# Altium footprint library General.PcbLib: 446 footprints (part 18 of 28)
Each footprint in its own frame and in the unit in brackets; x right, y up, seen from the top. Pads: shape width x height; smd on the part's side, far side on the other; paste and mask are expansions set on the pad; w line width, h text height; cw(c..) or ccw(c..) is an arc to the next point about the centre after c.
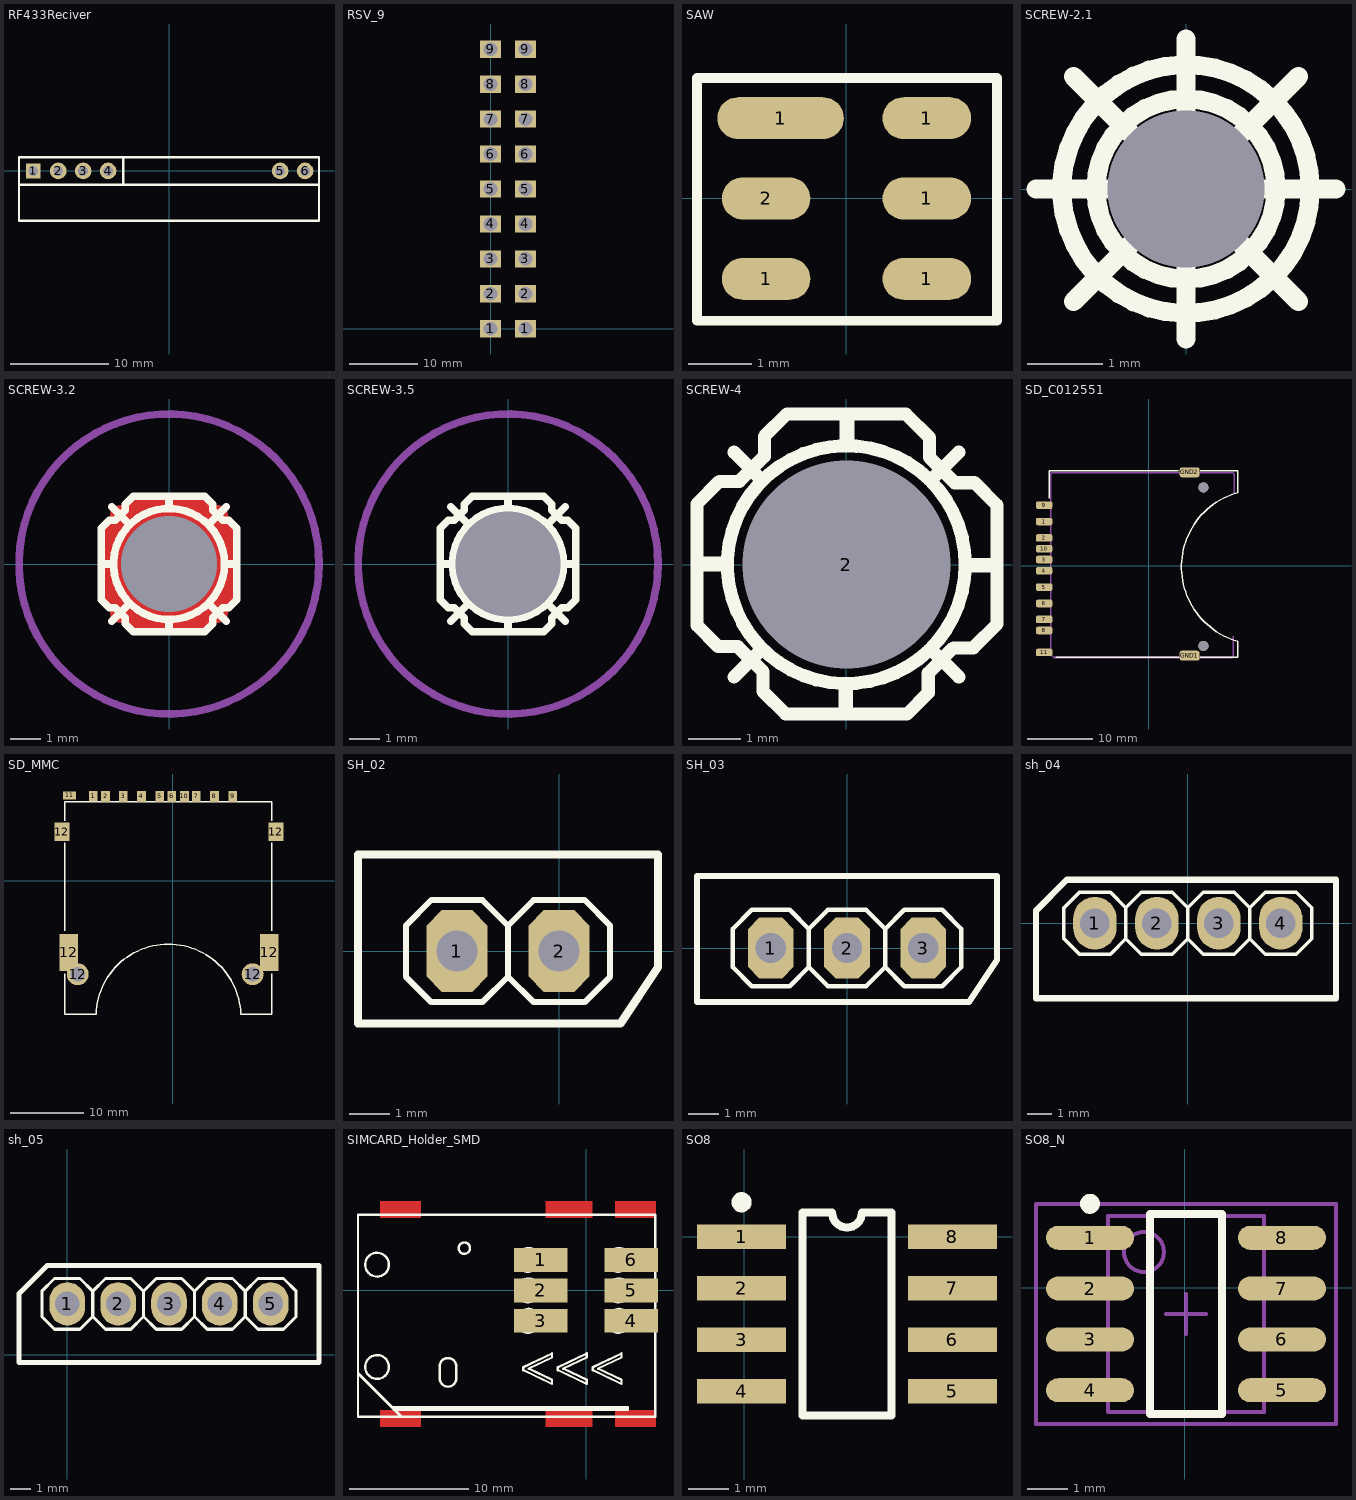
[diagram p17: the footprints below, top view; thin cyan lines are the x and y axes]

## RF433Reciver [mm]
pads (6):
  rect 1.5x1.5 hole 1: 1(-13.85,0)
  round 1.7 hole 1: 2(-11.31,0) 3(-8.77,0) 4(-6.23,0) 5(11.31,0) 6(13.85,0)
Top Overlay:
  lines w0.254: -15.309,-1.397 15.272,-1.397 ; -4.667,-1.397 -4.667,1.346 ; -15.309,-5.08 15.272,-5.08 15.272,1.397 -15.309,1.397 -15.309,1.194 -15.309,-5.08
3D body "rfModule_my.step": height 8.8, standoff -5.5, extent -15.145,-7.688 15.095,0.337

## RSV_9 [mm]
pads (18):
  rect 3x2.5 hole 2: 1(0,0) 1(5.08,0) 2(0,5.08) 2(5.08,5.08) 3(0,10.16) 3(5.08,10.16) 4(0,15.24) 4(5.08,15.24) 5(0,20.32) 5(5.08,20.32) 6(0,25.4) 6(5.08,25.4) 7(0,30.48) 7(5.08,30.48) 8(0,35.56) 8(5.08,35.56) 9(0,40.64) 9(5.08,40.64)

## SAW [mm]
pads (6):
  oval 1.4x0.665 smd: 1(-1.27,-1.27) 1(1.27,-1.27) 1(1.27,0) 1(1.27,1.27) 2(-1.27,0)
  oval 2x0.665 smd: 1(-1.041,1.27)
Top Overlay:
  lines w0.152: -2.362,-1.93 -2.362,1.905 2.379,1.905 2.379,-1.93 -2.362,-1.93
3D body "saw.STEP": height 1.14, standoff -0.09, extent -1.525,-1.473 1.475,1.527

## SCREW-2.1 [mm]
pads (1):
  round 0 hole 2.1 unplated: 1(0,0)
Top Overlay:
  circle w0.254: c0,0 r1.201
  circle w0.254: c0,0 r1.657
  lines w0.254: -2,0 2,0 ; -1.5,-1.5 1.5,1.5 ; -1.5,1.5 1.5,-1.5 ; 0,-2 0,2
Bottom Overlay:
  circle w0.254: c0,0 r1.657
  circle w0.254: c0,0 r1.201
  lines w0.254: -2,0 2,0 ; -1.5,-1.5 1.5,1.5 ; -1.5,1.5 1.5,-1.5 ; 0,-2 0,2

## SCREW-3.2 [mm]
height 1.35
pads (1):
  round 0 hole 3.2: 1(0,0)
Top Layer:
  pour cut-out: -1.194,-2.261 1.194,-2.261 1.46,-1.994 1.905,-1.905 1.994,-1.46 2.261,-1.194 2.261,1.194 1.994,1.46 1.905,1.905 1.46,1.994 1.194,2.261 -1.194,2.261 -1.46,1.994 -1.905,1.905 -1.994,1.46 -2.261,1.194 -2.261,-1.194 -1.994,-1.46 -1.905,-1.905 -1.46,-1.994
Bottom Layer:
  pour cut-out: -1.194,-2.261 1.194,-2.261 1.46,-1.994 1.905,-1.905 1.994,-1.46 2.261,-1.194 2.261,1.194 1.994,1.46 1.905,1.905 1.46,1.994 1.194,2.261 -1.194,2.261 -1.46,1.994 -1.905,1.905 -1.994,1.46 -2.261,1.194 -2.261,-1.194 -1.994,-1.46 -1.905,-1.905 -1.46,-1.994
Top Overlay:
  circle w0.254: c0,0 r1.852
  lines w0.254: -1.905,-1.905 -1.321,-1.321 ; -1.905,1.905 -1.321,1.321 ; 1.321,-1.321 1.905,-1.905 ; 1.321,1.321 1.905,1.905 ; -2.261,0 -2.261,-1.194 -1.994,-1.46 -1.791,-1.46 -1.46,-1.791 -1.46,-1.994 -1.194,-2.261 0,-2.261 ; -2.261,0 -1.854,0 -2.261,0 ; -2.261,0 -2.261,1.194 -1.994,1.46 -1.791,1.46 -1.46,1.791 -1.46,1.994 -1.194,2.261 0,2.261 ; 0,-2.261 1.194,-2.261 1.46,-1.994 1.46,-1.791 1.791,-1.46 1.994,-1.46 2.261,-1.194 2.261,0 ; 0,-2.261 0,-1.854 0,-2.261 ; 0,2.261 1.194,2.261 1.46,1.994 1.46,1.791 1.791,1.46 1.994,1.46 2.261,1.194 2.261,0 ; 0,2.261 0,1.854 0,2.261 ; 2.261,0 1.854,0 2.261,0
Mechanical 15:
  circle w0.254: c0,0 r5
3D body "DLSP-1-3.STEP": height 4, standoff -8.8, extent -2.994,-2.997 2.994,2.997

## SCREW-3.5 [mm]
height 1.35
pads (1):
  round 0 hole 3.5 unplated: 1(0,0)
Top Overlay:
  circle w0.254: c0,0 r1.852
  lines w0.254: -1.905,-1.905 -1.321,-1.321 ; -1.905,1.905 -1.321,1.321 ; 1.321,-1.321 1.905,-1.905 ; 1.321,1.321 1.905,1.905 ; -2.261,0 -2.261,-1.194 -1.994,-1.46 -1.791,-1.46 -1.46,-1.791 -1.46,-1.994 -1.194,-2.261 0,-2.261 ; -2.261,0 -1.854,0 -2.261,0 ; -2.261,0 -2.261,1.194 -1.994,1.46 -1.791,1.46 -1.46,1.791 -1.46,1.994 -1.194,2.261 0,2.261 ; 0,-2.261 1.194,-2.261 1.46,-1.994 1.46,-1.791 1.791,-1.46 1.994,-1.46 2.261,-1.194 2.261,0 ; 0,-2.261 0,-1.854 0,-2.261 ; 0,2.261 1.194,2.261 1.46,1.994 1.46,1.791 1.791,1.46 1.994,1.46 2.261,1.194 2.261,0 ; 0,2.261 0,1.854 0,2.261 ; 2.261,0 1.854,0 2.261,0
Bottom Overlay:
  circle w0.254: c0,0 r1.852
  lines w0.254: -1.905,-1.905 -1.321,-1.321 ; -1.905,1.905 -1.321,1.321 ; 1.321,-1.321 1.905,-1.905 ; 1.321,1.321 1.905,1.905 ; -2.261,0 -1.854,0 -2.261,0 ; -2.261,0 -2.261,1.194 -1.994,1.46 -1.791,1.46 -1.46,1.791 -1.46,1.994 -1.194,2.261 0,2.261 ; -2.261,0 -2.261,-1.194 -1.994,-1.46 -1.791,-1.46 -1.46,-1.791 -1.46,-1.994 -1.194,-2.261 0,-2.261 ; 0,-2.261 0,-1.854 0,-2.261 ; 0,-2.261 1.194,-2.261 1.46,-1.994 1.46,-1.791 1.791,-1.46 1.994,-1.46 2.261,-1.194 2.261,0 ; 0,2.261 1.194,2.261 1.46,1.994 1.46,1.791 1.791,1.46 1.994,1.46 2.261,1.194 2.261,0 ; 0,2.261 0,1.854 0,2.261 ; 2.261,0 1.854,0 2.261,0
Mechanical 15:
  circle w0.254: c0,0 r5

## SCREW-4 [mm]
pads (1):
  round 1.5 hole 4: 2(0,0)
Top Overlay:
  circle w0.254: c0,0 r2.286
  lines w0.254: -2.311,0.025 -2.87,0.025 -2.87,-1.168 -2.464,-1.575 -2.083,-1.575 -1.6,-2.057 -1.6,-2.438 -1.168,-2.87 0,-2.87 0,-2.286 ; -2.286,0 -2.87,0 -2.87,1.168 -2.438,1.6 -2.057,1.6 -1.575,2.083 -1.575,2.464 -1.143,2.896 0.025,2.896 0.025,2.311 ; -2.159,-2.159 -1.626,-1.626 ; -2.159,2.159 -1.626,1.626 ; -0.025,-2.311 -0.025,-2.87 1.168,-2.87 1.575,-2.464 1.575,-2.083 2.057,-1.6 2.438,-1.6 2.896,-1.143 2.896,0 2.286,0 ; 0,2.286 0,2.896 1.143,2.896 1.6,2.438 1.6,2.057 2.083,1.575 2.464,1.575 2.896,1.143 2.896,-0.025 2.311,-0.025 ; 1.626,-1.626 2.159,-2.159 ; 1.626,1.626 2.159,2.159

## SD_C012551 [mm]
pads (15):
  rrect50% 2.5x1.16 smd: 1(-15.96,6.734) 2(-15.96,4.234) 3(-15.96,0.934) 4(-15.96,-0.776) 5(-15.96,-3.276) 6(-15.96,-5.776) 7(-15.96,-8.196) 8(-15.96,-9.896) 9(-15.96,9.234) 10(-15.96,2.584) 11(-15.96,-13.246)
  rrect50% 3.048x1.524 smd: GND1(6.24,-13.746) GND2(6.24,14.254)
  round 1.55 hole 1.55 unplated: MH1(8.34,-12.246) MH2(8.34,11.954)
Top Overlay:
  lines w0.2: -15.21,10.254 -15.21,14.474 4.49,14.474 ; -14.21,-13.966 4.59,-13.966 ; 7.89,-13.966 13.59,-13.966 13.59,-11.545 cw(c16.79,-0.187) 13.586,11.169 13.586,14.47 13.581,14.474 7.89,14.474
Mechanical 1:
  lines w0.254: -14.956,-13.559 -14.956,14.102
Mechanical 13:
  lines w0.254: -14.956,-13.559 -14.494,-14.021 12.776,-14.021 12.929,-13.868 12.929,-10.77 ; -14.834,14.173 12.852,14.173 13.056,13.97 13.056,11.125
3D body "SD card.stp": height 2.23, standoff 0.13, extent -14.281,-11.658 17.719,12.342
3D body: height 0.3, standoff 0, extent -16.216,-13.7 -15.273,-12.854
3D body: height 2.4, standoff 2, extent -15.932,8.924 -12.749,9.517
3D body: height 2.38, standoff 0, extent -15.932,8.924 -15.311,9.517
3D body: height 0.3, standoff 0, extent -16.412,8.924 -15.494,9.512
3D body: height 2, standoff 0.3, extent -11.98,-14.065 12.593,-13.698
3D body: height 2.8, standoff 0, extent -14.956,-13.697 -13.819,13.773
3D body: height 2.9, standoff 0, extent -15.098,-12.795 -13.468,-8.558
3D body: height 2.9, standoff 0, extent -14.976,-4.409 -13.66,-0.876
3D body: height 2.9, standoff 0, extent -15.025,2.219 -13.739,6.637
3D body: height 2.9, standoff 0, extent -14.941,13.713 3.994,14.118
3D body: height 2, standoff 0, extent 3.961,13.851 12.475,14.108
3D body: height 2.8, standoff 0, extent 5.059,-13.96 7.511,-13.536
3D body: height 2.8, standoff 0, extent 5.598,14.254 6.625,14.57
3D body: height 2.8, standoff 0, extent -12.927,-13.968 -11.979,-13.743
3D body: height 0.3, standoff 0, extent -16.448,6.398 -15.53,6.986
3D body: height 2.38, standoff 0, extent -15.968,6.398 -15.347,6.991
3D body: height 2.4, standoff 2, extent -15.968,6.398 -12.785,6.991
3D body: height 0.3, standoff 0, extent -16.404,3.935 -15.486,4.523
3D body: height 2.38, standoff 0, extent -15.924,3.935 -15.303,4.528
3D body: height 2.4, standoff 2, extent -15.924,3.935 -12.741,4.528
3D body: height 0.3, standoff 0, extent -16.551,2.239 -15.633,2.827
3D body: height 2.38, standoff 0, extent -16.071,2.239 -15.45,2.832
3D body: height 2.4, standoff 2, extent -16.071,2.239 -12.888,2.832
3D body: height 0.3, standoff 0, extent -16.389,0.602 -15.471,1.19
3D body: height 2.38, standoff 0, extent -15.909,0.602 -15.288,1.195
3D body: height 2.4, standoff 2, extent -15.909,0.602 -12.726,1.195
3D body: height 0.3, standoff 0, extent -16.374,-1.08 -15.456,-0.492
3D body: height 2.38, standoff 0, extent -15.894,-1.08 -15.273,-0.487
3D body: height 2.4, standoff 2, extent -15.894,-1.08 -12.711,-0.487
3D body: height 0.3, standoff 0, extent -16.345,-3.513 -15.427,-2.925
3D body: height 2.38, standoff 0, extent -15.865,-3.513 -15.244,-2.92
3D body: height 2.4, standoff 2, extent -15.865,-3.513 -12.682,-2.92
3D body: height 0.3, standoff 0, extent -16.345,-6.065 -15.427,-5.477
3D body: height 2.38, standoff 0, extent -15.865,-6.065 -15.244,-5.472
3D body: height 2.4, standoff 2, extent -15.865,-6.065 -12.682,-5.472
3D body: height 0.3, standoff 0, extent -16.286,-8.528 -15.368,-7.94
3D body: height 2.38, standoff 0, extent -15.806,-8.528 -15.185,-7.935
3D body: height 2.4, standoff 2, extent -15.806,-8.528 -12.623,-7.935
3D body: height 0.3, standoff 0, extent -16.286,-10.165 -15.368,-9.577
3D body: height 2.38, standoff 0, extent -15.806,-10.165 -15.185,-9.572
3D body: height 2.4, standoff 2, extent -15.806,-10.165 -12.623,-9.572
3D body: height 2.4, standoff 2, extent -16.236,-13.045 -13.053,-12.854
3D body: height 2.38, standoff 0, extent -16.236,-13.049 -15.278,-12.851
3D body: height 2.9, standoff 2.59, extent -14.681,-14.148 13.208,14.224
3D body: height 0.89, standoff 0.03, extent -14.836,-13.905 12.875,14.213

## SD_MMC [mm]
height 0.051
pads (17):
  rect 1.2x1.5 smd: 1(-10.871,11.582) 2(-9.183,11.562) 3(-6.763,11.562) 4(-4.263,11.562) 5(-1.763,11.562) 6(-0.127,11.557) 7(3.237,11.562) 8(5.737,11.562) 9(8.237,11.562) 10(1.626,11.562)
  rect 1.778x1.1 smd: 11(-14.097,11.684)
  rect 2x2.5 smd: 12(-15.143,6.712) 12(14.157,6.712)
  rect 2.54x5.08 smd: 12(-14.243,-9.799) 12(13.259,-9.799)
  round 3 hole 2 unplated: 12(-12.989,-12.788) 12(10.957,-12.788)
Top Overlay:
  lines w0.203: -14.743,-12.7 -14.743,-18.288 -10.483,-18.288 cw(c-0.573,-18.585) 9.337,-18.288 13.607,-18.288 13.607,-12.7 ; -14.743,-6.858 -14.743,0.712 ; -14.743,0.508 -14.743,2.212 -14.743,5.212 ; -14.743,8.212 -14.743,10.812 13.607,10.812 13.607,8.212 ; 13.589,-6.858 13.607,5.212
3D body "socket_a-sd-09-c-a-1-3.stp": height 2.65, standoff -0.7, extent -15.35,-18.25 13.45,12.05

## SH_02 [mil]
pads (2):
  oct 60x80 hole 40: 1(-100,0) 2(0,0)
Top Overlay:
  rectangle: -110,-10 -90,10
  rectangle: -10,-10 10,10
  lines w6: -50,-25 -25,-50 25,-50 50,-25 50,25 25,50 -25,50 -50,25 ; -50,-25 -75,-50 -125,-50 -150,-25 -150,25 -125,50 -75,50 -50,25 ; -50,-25 -50,25
  lines w7.87: -196.85,-70.87 60.1,-70.87 96.85,-15.75 96.85,94.49 -196.85,94.49 -196.85,-70.87

## SH_03 [mil]
pads (3):
  oct 60x80 hole 40: 1(-100,0) 2(0,0) 3(100,0)
Top Overlay:
  rectangle: -10,-10 10,10
  rectangle: -110,-10 -90,10
  rectangle: 90,-10 110,10
  lines w6: -50,-25 -50,25 ; -50,-25 -75,-50 -125,-50 -150,-25 -150,25 -125,50 -75,50 -50,25 ; -50,-25 -25,-50 25,-50 50,-25 ; -50,25 -25,50 25,50 50,25 ; 50,-25 50,25 ; 50,-25 75,-50 125,-50 150,-25 150,25 125,50 75,50 50,25
  lines w7.87: -196.85,-70.87 -196.85,94.49 196.85,94.49 196.85,-15.75 160.1,-70.87 149.61,-70.87 -196.85,-70.87
3D body "pingerd.STEP": height 242.86, standoff -136.91, extent -197.61,-70.87 197.61,94.65

## sh_04 [mil] "wtb 2.54"
pads (4):
  oval 70x85 hole 48: 1(-150,0) 2(-50,0) 3(50,0) 4(150,0)
Top Overlay:
  lines w6: -100,-25 -100,25 ; -100,-25 -125,-50 -175,-50 -200,-25 -200,25 -175,50 -125,50 -100,25 ; -100,-25 -75,-50 -25,-50 0,-25 ; -100,25 -75,50 -25,50 0,25 ; 0,-25 0,25 ; 0,-25 25,-50 75,-50 100,-25 ; 0,25 25,50 75,50 100,25 ; 100,-25 100,25 ; 100,-25 125,-50 175,-50 200,-25 200,25 175,50 125,50 100,25
  lines w10: -245,-121 239.09,-121 239.09,70 -195,70 -245,20 -245,-121
3D body "WTB-sh-04.stp": height 234.25, standoff -135.83, extent -245.09,-121.24 243.09,71.67

## sh_05 [mil] "wtb 2.54."
pads (5):
  oval 70x85 hole 48: 1(0,100) 2(100,100) 3(200,100) 4(300,100) 5(400,100)
Top Overlay:
  lines w6: 50,75 75,50 125,50 150,75 ; 50,75 25,50 -25,50 -50,75 -50,125 -25,150 25,150 50,125 ; 50,75 50,125 ; 50,125 75,150 125,150 150,125 ; 150,75 175,50 225,50 250,75 ; 150,75 150,125 ; 150,125 175,150 225,150 250,125 ; 250,75 275,50 325,50 350,75 ; 250,75 250,125 ; 250,125 275,150 325,150 350,125 ; 350,75 375,50 425,50 450,75 450,125 425,150 375,150 350,125 ; 350,75 350,125
  lines w10: -95,-15 -95,120 -40,175 495,175 495,-15 -95,-15
3D body "WTB-sh05.stp": height 234.25, standoff -135.83, extent -93.3,-17.24 493.31,175.68

## SIMCARD_Holder_SMD [mm] "Kheshbi"
height 1.4
pads (6):
  rect 4.5x2 smd: 1(-3.802,2.56) 2(-3.802,0) 3(-3.802,-2.56) 4(3.796,-2.56) 5(3.796,0) 6(3.802,2.56)
Top Layer:
  rectangle: 2.457,-11.486 5.881,-10.06
  rectangle: -3.418,-11.486 0.535,-10.06
  rectangle: -17.302,-11.486 -13.878,-10.06
  rectangle: -17.307,6.086 -13.883,7.512
  rectangle: -3.424,6.086 0.529,7.512
  rectangle: 2.452,6.086 5.875,7.512
Top Overlay:
  circle w0.2: c2.73,2.559 r1
  circle w0.2: c2.73,-0.001 r1
  circle w0.2: c2.73,-2.561 r1
  circle w0.2: c-4.87,2.559 r1
  circle w0.2: c-4.87,-0.001 r1
  circle w0.2: c-4.87,-2.561 r1
  circle w0.2: c-17.57,2.159 r1
  circle w0.2: c-10.232,3.547 r0.48
  circle w0.2: c-17.57,-6.441 r1
  lines w0.2: -19.17,-10.641 -19.17,6.359 5.83,6.359 5.83,-10.641 -19.17,-10.641 ; -16.151,-10.044 3.515,-10.044 3.515,-9.826 -16.151,-9.826 -16.151,-10.044 ; -12.304,-7.39 ccw(c-11.606,-7.39) -10.907,-7.39 -10.907,-6.392 ccw(c-11.606,-6.392) -12.304,-6.392 -12.304,-7.39 ; -5.278,-6.704 -5.278,-6.459 -2.855,-5.302 -2.855,-5.644 -4.819,-6.581 -2.855,-7.519 -2.855,-7.86 -5.278,-6.704 ; -2.361,-6.704 -2.361,-6.459 0.062,-5.302 0.062,-5.644 -1.903,-6.581 0.062,-7.519 0.062,-7.86 -2.361,-6.704 ; 0.555,-6.704 0.555,-6.459 2.978,-5.302 2.978,-5.644 1.014,-6.581 2.978,-7.519 2.978,-7.86 0.555,-6.704
  lines w0.254: -19.127,-7.02 -15.56,-10.587
Top Solder:
  rectangle: -17.307,6.086 -13.883,7.512
  rectangle: -3.424,6.086 0,7.512
  rectangle: 2.452,6.086 5.876,7.512
  rectangle: 2.457,-11.486 5.881,-10.06
  rectangle: -3.418,-11.486 0.006,-10.06
  rectangle: -17.302,-11.486 -13.878,-10.06
3D body "SIMCARD Holder.STEP": height 1.52, standoff 0.01, extent -19.17,-10.655 5.83,6.345

## SO8 [mm]
pads (8):
  rect 2.2x0.6 smd: 1(-0.06,0) 2(-0.06,-1.27) 3(-0.06,-2.54) 4(-0.06,-3.81) 5(5.14,-3.81) 6(5.14,-2.54) 7(5.14,-1.27) 8(5.14,0)
Top Overlay:
  circle w0.25: c-0.06,0.85 r0.125
  lines w0.2: 1.44,-4.405 3.64,-4.405 3.64,0.595 2.907,0.595 cw(c2.54,0.595) 2.173,0.595 1.44,0.595 1.44,-4.405

## SO8_N [mm]
pads (8):
  oval 2.2x0.6 smd: 1(-2.375,1.245) 2(-2.375,-0.025) 3(-2.375,-1.295) 4(-2.375,-2.565) 5(2.425,-2.565) 6(2.425,-1.295) 7(2.425,-0.025) 8(2.425,1.245)
Top Overlay:
  circle w0.25: c-2.375,2.095 r0.125
  lines w0.2: -0.875,-3.16 0.925,-3.16 0.925,1.84 -0.875,1.84 -0.875,-3.16
Mechanical 13:
  circle w0.1: c-1.025,0.89 r0.5
  lines w0.1: -1.925,-3.11 1.975,-3.11 1.975,1.79 -1.925,1.79 -1.925,-3.11
Mechanical 15:
  lines w0.1: -0.475,-0.66 0.525,-0.66 ; 0.025,-1.16 0.025,-0.16 ; -3.725,-3.41 3.775,-3.41 3.775,2.09 -3.725,2.09 -3.725,-3.41